# Altium footprint library ref-packages-longpad.PCBLIB: 1527 footprints (part 45 of 103)
Each footprint in its own frame and in the unit in brackets; x right, y up, seen from the top. Pads: shape width x height; smd on the part's side, far side on the other; paste and mask are expansions set on the pad; w line width, h text height; cw(c..) or ccw(c..) is an arc to the next point about the centre after c.
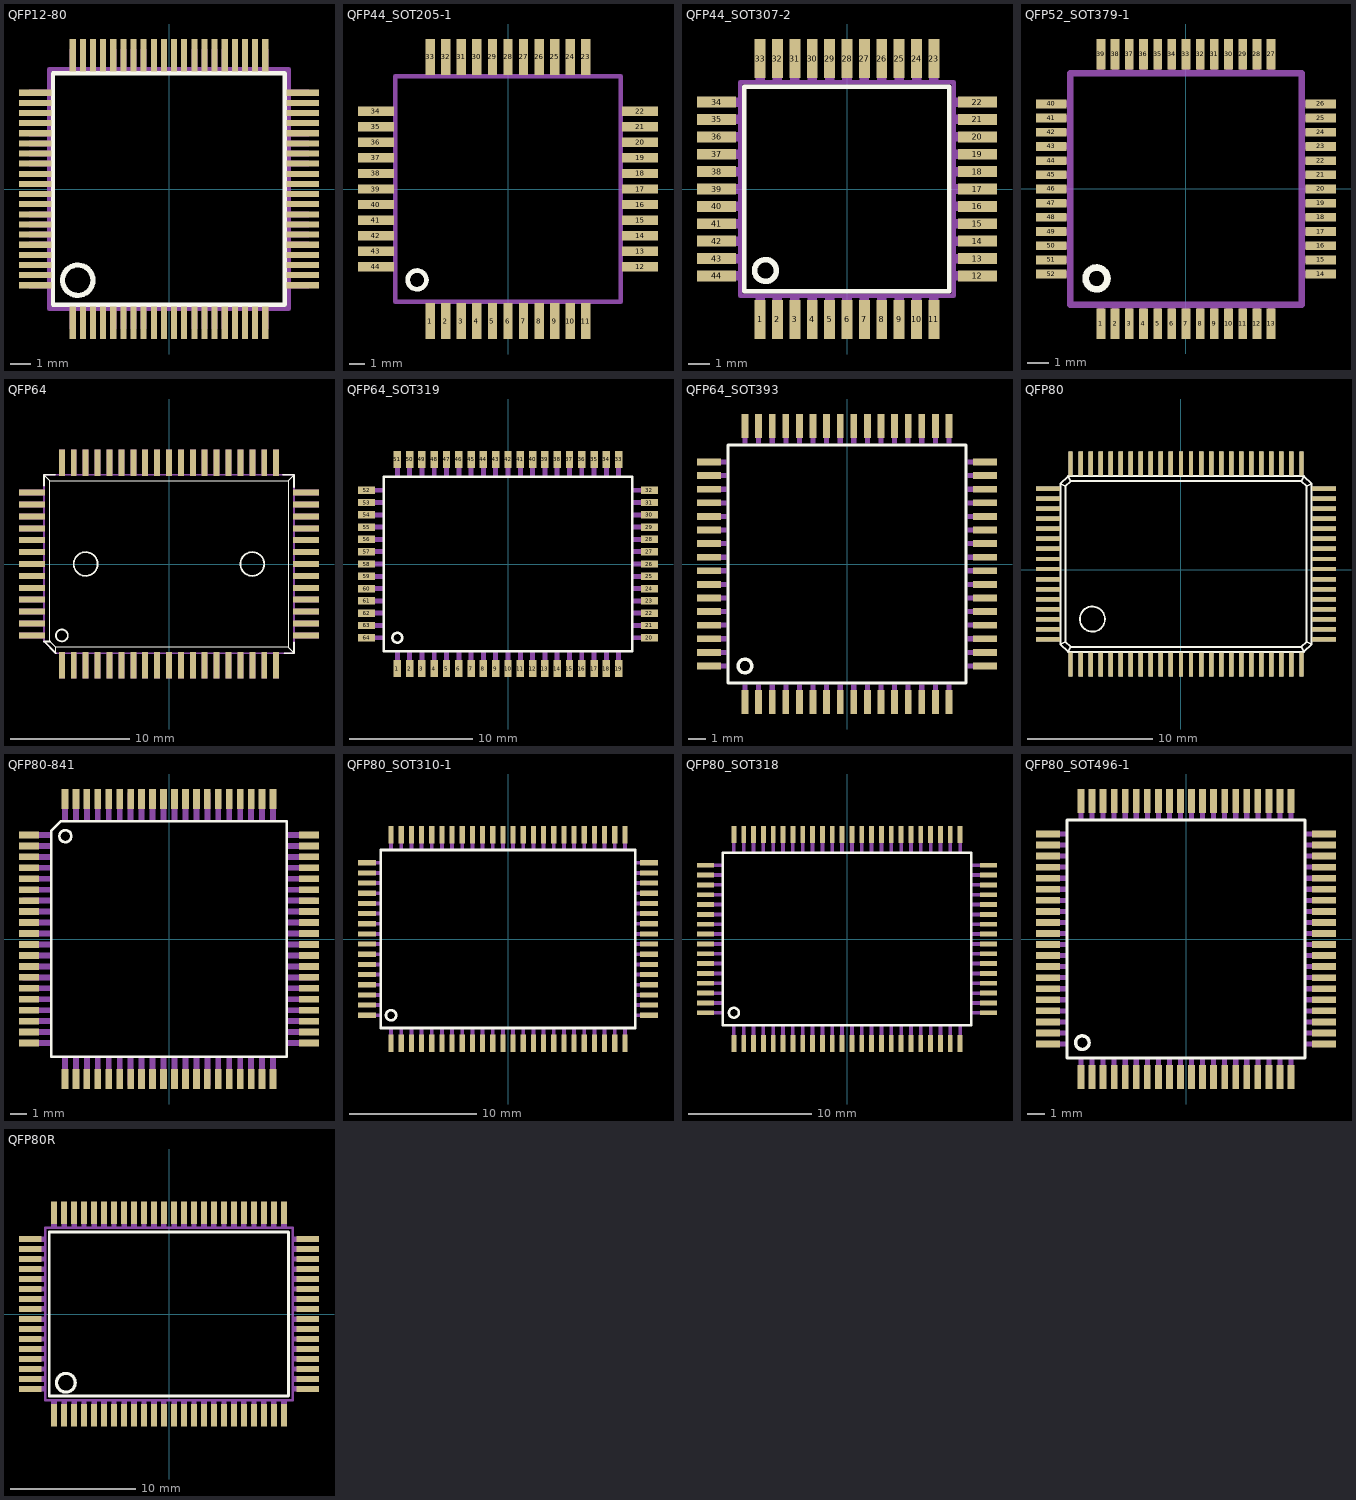
[diagram p44: the footprints below, top view; thin cyan lines are the x and y axes]

## QFP12-80 [mil]
pads (80):
  rect 11.81x62.99 smd: 1(-187.01,-259.84) 2(-167.32,-259.84) 3(-147.64,-259.84) 4(-127.95,-259.84) 5(-108.27,-259.84) 6(-88.58,-259.84) 7(-68.9,-259.84) 8(-49.21,-259.84) 9(-29.53,-259.84) 10(-9.84,-259.84) 11(9.84,-259.84) 12(29.53,-259.84) 13(49.21,-259.84) 14(68.9,-259.84) 15(88.58,-259.84) 16(108.27,-259.84) 17(127.95,-259.84) 18(147.64,-259.84) 19(167.32,-259.84) 20(187.01,-259.84) 41(187.01,259.84) 42(167.32,259.84) 43(147.64,259.84) 44(127.95,259.84) 45(108.27,259.84) 46(88.58,259.84) 47(68.9,259.84) 48(49.21,259.84) 49(29.53,259.84) 50(9.84,259.84) 51(-9.84,259.84) 52(-29.53,259.84) 53(-49.21,259.84) 54(-68.9,259.84) 55(-88.58,259.84) 56(-108.27,259.84) 57(-127.95,259.84) 58(-147.64,259.84) 59(-167.32,259.84) 60(-187.01,259.84)
  rect 62.99x11.81 smd: 21(259.84,-187.01) 22(259.84,-167.32) 23(259.84,-147.64) 24(259.84,-127.95) 25(259.84,-108.27) 26(259.84,-88.58) 27(259.84,-68.9) 28(259.84,-49.21) 29(259.84,-29.53) 30(259.84,-9.84) 31(259.84,9.84) 32(259.84,29.53) 33(259.84,49.21) 34(259.84,68.9) 35(259.84,88.58) 36(259.84,108.27) 37(259.84,127.95) 38(259.84,147.64) 39(259.84,167.32) 40(259.84,187.01) 61(-259.84,187.01) 62(-259.84,167.32) 63(-259.84,147.64) 64(-259.84,127.95) 65(-259.84,108.27) 66(-259.84,88.58) 67(-259.84,68.9) 68(-259.84,49.21) 69(-259.84,29.53) 70(-259.84,9.84) 71(-259.84,-9.84) 72(-259.84,-29.53) 73(-259.84,-49.21) 74(-259.84,-68.9) 75(-259.84,-88.58) 76(-259.84,-108.27) 77(-259.84,-127.95) 78(-259.84,-147.64) 79(-259.84,-167.32) 80(-259.84,-187.01)
Top Overlay:
  circle w10: c-177.17,-177.17 r29.53
  lines w8: -225.2,-224.8 224.8,-224.8 224.8,224.8 -225.2,224.8 -225.2,-224.8
Mechanical 16:
  rectangle: -192.91,-271.65 -181.1,-234.25
  rectangle: -173.23,-271.65 -161.42,-234.25
  rectangle: -153.54,-271.65 -141.73,-234.25
  rectangle: -133.86,-271.65 -122.05,-234.25
  rectangle: -114.17,-271.65 -102.36,-234.25
  rectangle: -94.49,-271.65 -82.68,-234.25
  rectangle: -74.8,-271.65 -62.99,-234.25
  rectangle: -55.12,-271.65 -43.31,-234.25
  rectangle: -35.43,-271.65 -23.62,-234.25
  rectangle: -15.75,-271.65 -3.94,-234.25
  rectangle: 3.94,-271.65 15.75,-234.25
  rectangle: 23.62,-271.65 35.43,-234.25
  rectangle: 43.31,-271.65 55.12,-234.25
  rectangle: 62.99,-271.65 74.8,-234.25
  rectangle: 82.68,-271.65 94.49,-234.25
  rectangle: 102.36,-271.65 114.17,-234.25
  rectangle: 122.05,-271.65 133.86,-234.25
  rectangle: 141.73,-271.65 153.54,-234.25
  rectangle: 161.42,-271.65 173.23,-234.25
  rectangle: 181.1,-271.65 192.91,-234.25
  rectangle: 234.25,-192.91 271.65,-181.1
  rectangle: 234.25,-173.23 271.65,-161.42
  rectangle: 234.25,-153.54 271.65,-141.73
  rectangle: 234.25,-133.86 271.65,-122.05
  rectangle: 234.25,-114.17 271.65,-102.36
  rectangle: 234.25,-94.49 271.65,-82.68
  rectangle: 234.25,-74.8 271.65,-62.99
  rectangle: 234.25,-55.12 271.65,-43.31
  rectangle: 234.25,-35.43 271.65,-23.62
  rectangle: 234.25,-15.75 271.65,-3.94
  rectangle: 234.25,3.94 271.65,15.75
  rectangle: 234.25,23.62 271.65,35.43
  rectangle: 234.25,43.31 271.65,55.12
  rectangle: 234.25,62.99 271.65,74.8
  rectangle: 234.25,82.68 271.65,94.49
  rectangle: 234.25,102.36 271.65,114.17
  rectangle: 234.25,122.05 271.65,133.86
  rectangle: 234.25,141.73 271.65,153.54
  rectangle: 234.25,161.42 271.65,173.23
  rectangle: 234.25,181.1 271.65,192.91
  rectangle: 181.1,234.25 192.91,271.65
  rectangle: 161.42,234.25 173.23,271.65
  rectangle: 141.73,234.25 153.54,271.65
  rectangle: 122.05,234.25 133.86,271.65
  rectangle: 102.36,234.25 114.17,271.65
  rectangle: 82.68,234.25 94.49,271.65
  rectangle: 62.99,234.25 74.8,271.65
  rectangle: 43.31,234.25 55.12,271.65
  rectangle: 23.62,234.25 35.43,271.65
  rectangle: 3.94,234.25 15.75,271.65
  rectangle: -15.75,234.25 -3.94,271.65
  rectangle: -35.43,234.25 -23.62,271.65
  rectangle: -55.12,234.25 -43.31,271.65
  rectangle: -74.8,234.25 -62.99,271.65
  rectangle: -94.49,234.25 -82.68,271.65
  rectangle: -114.17,234.25 -102.36,271.65
  rectangle: -133.86,234.25 -122.05,271.65
  rectangle: -153.54,234.25 -141.73,271.65
  rectangle: -173.23,234.25 -161.42,271.65
  rectangle: -192.91,234.25 -181.1,271.65
  rectangle: -271.65,181.1 -234.25,192.91
  rectangle: -271.65,161.42 -234.25,173.23
  rectangle: -271.65,141.73 -234.25,153.54
  rectangle: -271.65,122.05 -234.25,133.86
  rectangle: -271.65,102.36 -234.25,114.17
  rectangle: -271.65,82.68 -234.25,94.49
  rectangle: -271.65,62.99 -234.25,74.8
  rectangle: -271.65,43.31 -234.25,55.12
  rectangle: -271.65,23.62 -234.25,35.43
  rectangle: -271.65,3.94 -234.25,15.75
  rectangle: -271.65,-15.75 -234.25,-3.94
  rectangle: -271.65,-35.43 -234.25,-23.62
  rectangle: -271.65,-55.12 -234.25,-43.31
  rectangle: -271.65,-74.8 -234.25,-62.99
  rectangle: -271.65,-94.49 -234.25,-82.68
  rectangle: -271.65,-114.17 -234.25,-102.36
  rectangle: -271.65,-133.86 -234.25,-122.05
  rectangle: -271.65,-153.54 -234.25,-141.73
  rectangle: -271.65,-173.23 -234.25,-161.42
  rectangle: -271.65,-192.91 -234.25,-181.1
  lines w8: -232.68,-232.68 232.68,-232.68 232.68,232.68 -232.68,232.68 -232.68,-232.68

## QFP44_SOT205-1 [mm]
pads (44):
  rect 0.6x2.3 smd: 1(-5,-8.5) 2(-4,-8.5) 3(-3,-8.5) 4(-2,-8.5) 5(-1,-8.5) 6(0,-8.5) 7(1,-8.5) 8(2,-8.5) 9(3,-8.5) 10(4,-8.5) 11(5,-8.5) 23(5,8.5) 24(4,8.5) 25(3,8.5) 26(2,8.5) 27(1,8.5) 28(0,8.5) 29(-1,8.5) 30(-2,8.5) 31(-3,8.5) 32(-4,8.5) 33(-5,8.5)
  rect 2.3x0.6 smd: 12(8.5,-5) 13(8.5,-4) 14(8.5,-3) 15(8.5,-2) 16(8.5,-1) 17(8.5,0) 18(8.5,1) 19(8.5,2) 20(8.5,3) 21(8.5,4) 22(8.5,5) 34(-8.5,5) 35(-8.5,4) 36(-8.5,3) 37(-8.5,2) 38(-8.5,1) 39(-8.5,0) 40(-8.5,-1) 41(-8.5,-2) 42(-8.5,-3) 43(-8.5,-4) 44(-8.5,-5)
Top Overlay:
  circle w0.305: c-5.85,-5.85 r0.6
Mechanical 16:
  rectangle: -5.25,-9.2 -4.75,-7.35
  rectangle: -4.25,-9.2 -3.75,-7.35
  rectangle: -3.25,-9.2 -2.75,-7.35
  rectangle: -2.25,-9.2 -1.75,-7.35
  rectangle: -1.25,-9.2 -0.75,-7.35
  rectangle: -0.25,-9.2 0.25,-7.35
  rectangle: 0.75,-9.2 1.25,-7.35
  rectangle: 1.75,-9.2 2.25,-7.35
  rectangle: 2.75,-9.2 3.25,-7.35
  rectangle: 3.75,-9.2 4.25,-7.35
  rectangle: 4.75,-9.2 5.25,-7.35
  rectangle: 7.35,-5.25 9.2,-4.75
  rectangle: 7.35,-4.25 9.2,-3.75
  rectangle: 7.35,-3.25 9.2,-2.75
  rectangle: 7.35,-2.25 9.2,-1.75
  rectangle: 7.35,-1.25 9.2,-0.75
  rectangle: 7.35,-0.25 9.2,0.25
  rectangle: 7.35,0.75 9.2,1.25
  rectangle: 7.35,1.75 9.2,2.25
  rectangle: 7.35,2.75 9.2,3.25
  rectangle: 7.35,3.75 9.2,4.25
  rectangle: 7.35,4.75 9.2,5.25
  rectangle: 4.75,7.35 5.25,9.2
  rectangle: 3.75,7.35 4.25,9.2
  rectangle: 2.75,7.35 3.25,9.2
  rectangle: 1.75,7.35 2.25,9.2
  rectangle: 0.75,7.35 1.25,9.2
  rectangle: -0.25,7.35 0.25,9.2
  rectangle: -1.25,7.35 -0.75,9.2
  rectangle: -2.25,7.35 -1.75,9.2
  rectangle: -3.25,7.35 -2.75,9.2
  rectangle: -4.25,7.35 -3.75,9.2
  rectangle: -5.25,7.35 -4.75,9.2
  rectangle: -9.2,4.75 -7.35,5.25
  rectangle: -9.2,3.75 -7.35,4.25
  rectangle: -9.2,2.75 -7.35,3.25
  rectangle: -9.2,1.75 -7.35,2.25
  rectangle: -9.2,0.75 -7.35,1.25
  rectangle: -9.2,-0.25 -7.35,0.25
  rectangle: -9.2,-1.25 -7.35,-0.75
  rectangle: -9.2,-2.25 -7.35,-1.75
  rectangle: -9.2,-3.25 -7.35,-2.75
  rectangle: -9.2,-4.25 -7.35,-3.75
  rectangle: -9.2,-5.25 -7.35,-4.75
  lines w0.305: -7.25,-7.25 7.25,-7.25 7.25,7.25 -7.25,7.25 -7.25,-7.25

## QFP44_SOT307-2 [mm]
pads (44):
  rect 0.5x1.8 smd: 1(-4,-6) 2(-3.2,-6) 3(-2.4,-6) 4(-1.6,-6) 5(-0.8,-6) 6(0,-6) 7(0.8,-6) 8(1.6,-6) 9(2.4,-6) 10(3.2,-6) 11(4,-6) 23(4,6) 24(3.2,6) 25(2.4,6) 26(1.6,6) 27(0.8,6) 28(0,6) 29(-0.8,6) 30(-1.6,6) 31(-2.4,6) 32(-3.2,6) 33(-4,6)
  rect 1.8x0.5 smd: 12(6,-4) 13(6,-3.2) 14(6,-2.4) 15(6,-1.6) 16(6,-0.8) 17(6,0) 18(6,0.8) 19(6,1.6) 20(6,2.4) 21(6,3.2) 22(6,4) 34(-6,4) 35(-6,3.2) 36(-6,2.4) 37(-6,1.6) 38(-6,0.8) 39(-6,0) 40(-6,-0.8) 41(-6,-1.6) 42(-6,-2.4) 43(-6,-3.2) 44(-6,-4)
Top Overlay:
  circle w0.254: c-3.75,-3.75 r0.5
  lines w0.203: -4.72,-4.71 4.71,-4.71 4.71,4.71 -4.72,4.71 -4.72,-4.71
Mechanical 16:
  rectangle: -4.22,-6.72 -3.78,-4.95
  rectangle: -3.42,-6.72 -2.98,-4.95
  rectangle: -2.62,-6.72 -2.18,-4.95
  rectangle: -1.82,-6.72 -1.38,-4.95
  rectangle: -1.02,-6.72 -0.58,-4.95
  rectangle: -0.22,-6.72 0.22,-4.95
  rectangle: 0.58,-6.72 1.02,-4.95
  rectangle: 1.38,-6.72 1.82,-4.95
  rectangle: 2.18,-6.72 2.62,-4.95
  rectangle: 2.98,-6.72 3.42,-4.95
  rectangle: 3.78,-6.72 4.22,-4.95
  rectangle: 4.95,-4.22 6.72,-3.78
  rectangle: 4.95,-3.42 6.72,-2.98
  rectangle: 4.95,-2.62 6.72,-2.18
  rectangle: 4.95,-1.82 6.72,-1.38
  rectangle: 4.95,-1.02 6.72,-0.58
  rectangle: 4.95,-0.22 6.72,0.22
  rectangle: 4.95,0.58 6.72,1.02
  rectangle: 4.95,1.38 6.72,1.82
  rectangle: 4.95,2.18 6.72,2.62
  rectangle: 4.95,2.98 6.72,3.42
  rectangle: 4.95,3.78 6.72,4.22
  rectangle: 3.78,4.95 4.22,6.72
  rectangle: 2.98,4.95 3.42,6.72
  rectangle: 2.18,4.95 2.62,6.72
  rectangle: 1.38,4.95 1.82,6.72
  rectangle: 0.58,4.95 1.02,6.72
  rectangle: -0.22,4.95 0.22,6.72
  rectangle: -1.02,4.95 -0.58,6.72
  rectangle: -1.82,4.95 -1.38,6.72
  rectangle: -2.62,4.95 -2.18,6.72
  rectangle: -3.42,4.95 -2.98,6.72
  rectangle: -4.22,4.95 -3.78,6.72
  rectangle: -6.72,3.78 -4.95,4.22
  rectangle: -6.72,2.98 -4.95,3.42
  rectangle: -6.72,2.18 -4.95,2.62
  rectangle: -6.72,1.38 -4.95,1.82
  rectangle: -6.72,0.58 -4.95,1.02
  rectangle: -6.72,-0.22 -4.95,0.22
  rectangle: -6.72,-1.02 -4.95,-0.58
  rectangle: -6.72,-1.82 -4.95,-1.38
  rectangle: -6.72,-2.62 -4.95,-2.18
  rectangle: -6.72,-3.42 -4.95,-2.98
  rectangle: -6.72,-4.22 -4.95,-3.78
  lines w0.203: -4.91,-4.91 4.91,-4.91 4.91,4.91 -4.91,4.91 -4.91,-4.91

## QFP52_SOT379-1 [mm]
pads (52):
  rect 0.4x1.4 smd: 1(-3.9,-6.175) 2(-3.25,-6.175) 3(-2.6,-6.175) 4(-1.95,-6.175) 5(-1.3,-6.175) 6(-0.65,-6.175) 7(0,-6.175) 8(0.65,-6.175) 9(1.3,-6.175) 10(1.95,-6.175) 11(2.6,-6.175) 12(3.25,-6.175) 13(3.9,-6.175) 27(3.9,6.175) 28(3.25,6.175) 29(2.6,6.175) 30(1.95,6.175) 31(1.3,6.175) 32(0.65,6.175) 33(0,6.175) 34(-0.65,6.175) 35(-1.3,6.175) 36(-1.95,6.175) 37(-2.6,6.175) 38(-3.25,6.175) 39(-3.9,6.175)
  rect 1.4x0.4 smd: 14(6.175,-3.9) 15(6.175,-3.25) 16(6.175,-2.6) 17(6.175,-1.95) 18(6.175,-1.3) 19(6.175,-0.65) 20(6.175,0) 21(6.175,0.65) 22(6.175,1.3) 23(6.175,1.95) 24(6.175,2.6) 25(6.175,3.25) 26(6.175,3.9) 40(-6.175,3.9) 41(-6.175,3.25) 42(-6.175,2.6) 43(-6.175,1.95) 44(-6.175,1.3) 45(-6.175,0.65) 46(-6.175,0) 47(-6.175,-0.65) 48(-6.175,-1.3) 49(-6.175,-1.95) 50(-6.175,-2.6) 51(-6.175,-3.25) 52(-6.175,-3.9)
Top Overlay:
  circle w0.305: c-4.1,-4.1 r0.5
Mechanical 16:
  rectangle: -4.05,-6.6 -3.75,-5.4
  rectangle: -3.4,-6.6 -3.1,-5.4
  rectangle: -2.75,-6.6 -2.45,-5.4
  rectangle: -2.1,-6.6 -1.8,-5.4
  rectangle: -1.45,-6.6 -1.15,-5.4
  rectangle: -0.8,-6.6 -0.5,-5.4
  rectangle: -0.15,-6.6 0.15,-5.4
  rectangle: 0.5,-6.6 0.8,-5.4
  rectangle: 1.15,-6.6 1.45,-5.4
  rectangle: 1.8,-6.6 2.1,-5.4
  rectangle: 2.45,-6.6 2.75,-5.4
  rectangle: 3.1,-6.6 3.4,-5.4
  rectangle: 3.75,-6.6 4.05,-5.4
  rectangle: 5.4,-4.05 6.6,-3.75
  rectangle: 5.4,-3.4 6.6,-3.1
  rectangle: 5.4,-2.75 6.6,-2.45
  rectangle: 5.4,-2.1 6.6,-1.8
  rectangle: 5.4,-1.45 6.6,-1.15
  rectangle: 5.4,-0.8 6.6,-0.5
  rectangle: 5.4,-0.15 6.6,0.15
  rectangle: 5.4,0.5 6.6,0.8
  rectangle: 5.4,1.15 6.6,1.45
  rectangle: 5.4,1.8 6.6,2.1
  rectangle: 5.4,2.45 6.6,2.75
  rectangle: 5.4,3.1 6.6,3.4
  rectangle: 5.4,3.75 6.6,4.05
  rectangle: 3.75,5.4 4.05,6.6
  rectangle: 3.1,5.4 3.4,6.6
  rectangle: 2.45,5.4 2.75,6.6
  rectangle: 1.8,5.4 2.1,6.6
  rectangle: 1.15,5.4 1.45,6.6
  rectangle: 0.5,5.4 0.8,6.6
  rectangle: -0.15,5.4 0.15,6.6
  rectangle: -0.8,5.4 -0.5,6.6
  rectangle: -1.45,5.4 -1.15,6.6
  rectangle: -2.1,5.4 -1.8,6.6
  rectangle: -2.75,5.4 -2.45,6.6
  rectangle: -3.4,5.4 -3.1,6.6
  rectangle: -4.05,5.4 -3.75,6.6
  rectangle: -6.6,3.75 -5.4,4.05
  rectangle: -6.6,3.1 -5.4,3.4
  rectangle: -6.6,2.45 -5.4,2.75
  rectangle: -6.6,1.8 -5.4,2.1
  rectangle: -6.6,1.15 -5.4,1.45
  rectangle: -6.6,0.5 -5.4,0.8
  rectangle: -6.6,-0.15 -5.4,0.15
  rectangle: -6.6,-0.8 -5.4,-0.5
  rectangle: -6.6,-1.45 -5.4,-1.15
  rectangle: -6.6,-2.1 -5.4,-1.8
  rectangle: -6.6,-2.75 -5.4,-2.45
  rectangle: -6.6,-3.4 -5.4,-3.1
  rectangle: -6.6,-4.05 -5.4,-3.75
  lines w0.305: -5.3,-5.3 5.3,-5.3 5.3,5.3 -5.3,5.3 -5.3,-5.3

## QFP64 [mm]
pads (64):
  rect 0.5x2.2 smd: 1(-9,-8.5) 2(-8,-8.5) 3(-7,-8.5) 4(-6,-8.5) 5(-5,-8.5) 6(-4,-8.5) 7(-3,-8.5) 8(-2,-8.5) 9(-1,-8.5) 10(0,-8.5) 11(1,-8.5) 12(2,-8.5) 13(3,-8.5) 14(4,-8.5) 15(5,-8.5) 16(6,-8.5) 17(7,-8.5) 18(8,-8.5) 19(9,-8.5) 33(9,8.5) 34(8,8.5) 35(7,8.5) 36(6,8.5) 37(5,8.5) 38(4,8.5) 39(3,8.5) 40(2,8.5) 41(1,8.5) 42(0,8.5) 43(-1,8.5) 44(-2,8.5) 45(-3,8.5) 46(-4,8.5) 47(-5,8.5) 48(-6,8.5) 49(-7,8.5) 50(-8,8.5) 51(-9,8.5)
  rect 2.2x0.5 smd: 20(11.5,-6) 21(11.5,-5) 22(11.5,-4) 23(11.5,-3) 24(11.5,-2) 25(11.5,-1) 26(11.5,0) 27(11.5,1) 28(11.5,2) 29(11.5,3) 30(11.5,4) 31(11.5,5) 32(11.5,6) 52(-11.5,6) 53(-11.5,5) 54(-11.5,4) 55(-11.5,3) 56(-11.5,2) 57(-11.5,1) 58(-11.5,0) 59(-11.5,-1) 60(-11.5,-2) 61(-11.5,-3) 62(-11.5,-4) 63(-11.5,-5) 64(-11.5,-6)
Top Overlay:
  circle w0.152: c-9,-6 r0.5
  circle w0.152: c7,0 r1
  circle w0.152: c-7,0 r1
  lines w0.051: -10.5,7.5 -10,7 ; -9.5,-7.5 -9.5,-7 ; 10.5,-7.5 10,-7 ; 10.5,7.5 10,7 ; -10,7 10,7 ; -10,7 -10,-6.5 -9.5,-7 ; -9.5,-7 10,-7 ; 10,-7 10,7
  lines w0.152: -10.5,6.581 -10.5,7.5 -9.566,7.5 ; -10,-6.5 -10.5,-6.5 -9.5,-7.5 ; 9.566,7.5 10.5,7.5 10.5,6.47 ; 9.677,-7.5 10.5,-7.5 10.5,-6.597
Mechanical 16:
  rectangle: -9.25,7.55 -8.75,9.6
  rectangle: -8.25,7.55 -7.75,9.6
  rectangle: -7.25,7.55 -6.75,9.6
  rectangle: -6.25,7.55 -5.75,9.6
  rectangle: -5.25,7.55 -4.75,9.6
  rectangle: -4.25,7.55 -3.75,9.6
  rectangle: -3.25,7.55 -2.75,9.6
  rectangle: -2.25,7.55 -1.75,9.6
  rectangle: -1.25,7.55 -0.75,9.6
  rectangle: -0.25,7.55 0.25,9.6
  rectangle: 0.75,7.55 1.25,9.6
  rectangle: 1.75,7.55 2.25,9.6
  rectangle: 2.75,7.55 3.25,9.6
  rectangle: 3.75,7.55 4.25,9.6
  rectangle: 4.75,7.55 5.25,9.6
  rectangle: 5.75,7.55 6.25,9.6
  rectangle: 6.75,7.55 7.25,9.6
  rectangle: 7.75,7.55 8.25,9.6
  rectangle: 8.75,7.55 9.25,9.6
  rectangle: 10.55,4.75 12.6,5.25
  rectangle: 10.55,5.75 12.6,6.25
  rectangle: 10.55,3.75 12.6,4.25
  rectangle: 10.55,2.75 12.6,3.25
  rectangle: 10.55,1.75 12.6,2.25
  rectangle: 10.55,0.75 12.6,1.25
  rectangle: 10.55,-0.25 12.6,0.25
  rectangle: 10.55,-1.25 12.6,-0.75
  rectangle: 10.55,-2.25 12.6,-1.75
  rectangle: 10.55,-3.25 12.6,-2.75
  rectangle: 10.55,-4.25 12.6,-3.75
  rectangle: 10.55,-5.25 12.6,-4.75
  rectangle: 10.55,-6.25 12.6,-5.75
  rectangle: 8.75,-9.6 9.25,-7.55
  rectangle: 7.75,-9.6 8.25,-7.55
  rectangle: 6.75,-9.6 7.25,-7.55
  rectangle: 5.75,-9.6 6.25,-7.55
  rectangle: 4.75,-9.6 5.25,-7.55
  rectangle: 3.75,-9.6 4.25,-7.55
  rectangle: 2.75,-9.6 3.25,-7.55
  rectangle: 1.75,-9.6 2.25,-7.55
  rectangle: 0.75,-9.6 1.25,-7.55
  rectangle: -0.25,-9.6 0.25,-7.55
  rectangle: -1.25,-9.6 -0.75,-7.55
  rectangle: -2.25,-9.6 -1.75,-7.55
  rectangle: -3.25,-9.6 -2.75,-7.55
  rectangle: -4.25,-9.6 -3.75,-7.55
  rectangle: -5.25,-9.6 -4.75,-7.55
  rectangle: -6.25,-9.6 -5.75,-7.55
  rectangle: -7.25,-9.6 -6.75,-7.55
  rectangle: -8.25,-9.6 -7.75,-7.55
  rectangle: -12.6,5.75 -10.55,6.25
  rectangle: -12.6,4.75 -10.55,5.25
  rectangle: -12.6,3.75 -10.55,4.25
  rectangle: -12.6,2.75 -10.55,3.25
  rectangle: -12.6,1.75 -10.55,2.25
  rectangle: -12.6,0.75 -10.55,1.25
  rectangle: -12.6,-0.25 -10.55,0.25
  rectangle: -12.6,-1.25 -10.55,-0.75
  rectangle: -12.6,-2.25 -10.55,-1.75
  rectangle: -12.6,-3.25 -10.55,-2.75
  rectangle: -12.6,-4.25 -10.55,-3.75
  rectangle: -12.6,-5.25 -10.55,-4.75
  rectangle: -12.6,-6.25 -10.55,-5.75
  rectangle: -9.25,-9.6 -8.75,-7.55
  lines w0.051: -10.5,-6.5 -10,-6.5 ; -9.5,-7.5 -9.5,-7
  lines w0.152: -10.5,-6.5 -9.5,-7.5 10.5,-7.5 10.5,7.5 -10.5,7.5 -10.5,-6.5

## QFP64_SOT319 [mm]
pads (64):
  rect 0.6x1.4 smd: 1(-9,-8.5) 2(-8,-8.5) 3(-7,-8.5) 4(-6,-8.5) 5(-5,-8.5) 6(-4,-8.5) 7(-3,-8.5) 8(-2,-8.5) 9(-1,-8.5) 10(0,-8.5) 11(1,-8.5) 12(2,-8.5) 13(3,-8.5) 14(4,-8.5) 15(5,-8.5) 16(6,-8.5) 17(7,-8.5) 18(8,-8.5) 19(9,-8.5) 33(9,8.5) 34(8,8.5) 35(7,8.5) 36(6,8.5) 37(5,8.5) 38(4,8.5) 39(3,8.5) 40(2,8.5) 41(1,8.5) 42(0,8.5) 43(-1,8.5) 44(-2,8.5) 45(-3,8.5) 46(-4,8.5) 47(-5,8.5) 48(-6,8.5) 49(-7,8.5) 50(-8,8.5) 51(-9,8.5)
  rect 1.4x0.6 smd: 20(11.5,-6) 21(11.5,-5) 22(11.5,-4) 23(11.5,-3) 24(11.5,-2) 25(11.5,-1) 26(11.5,0) 27(11.5,1) 28(11.5,2) 29(11.5,3) 30(11.5,4) 31(11.5,5) 32(11.5,6) 52(-11.5,6) 53(-11.5,5) 54(-11.5,4) 55(-11.5,3) 56(-11.5,2) 57(-11.5,1) 58(-11.5,0) 59(-11.5,-1) 60(-11.5,-2) 61(-11.5,-3) 62(-11.5,-4) 63(-11.5,-5) 64(-11.5,-6)
Top Overlay:
  circle w0.203: c-9,-6 r0.4
  lines w0.203: -10.1,-7.1 10.1,-7.1 10.1,7.1 -10.1,7.1 -10.1,-7.1
Mechanical 16:
  rectangle: -9.2,-8.8 -8.8,-7.15
  rectangle: -8.2,-8.8 -7.8,-7.15
  rectangle: -7.2,-8.8 -6.8,-7.15
  rectangle: -6.2,-8.8 -5.8,-7.15
  rectangle: -5.2,-8.8 -4.8,-7.15
  rectangle: -4.2,-8.8 -3.8,-7.15
  rectangle: -3.2,-8.8 -2.8,-7.15
  rectangle: -2.2,-8.8 -1.8,-7.15
  rectangle: -1.2,-8.8 -0.8,-7.15
  rectangle: -0.2,-8.8 0.2,-7.15
  rectangle: 0.8,-8.8 1.2,-7.15
  rectangle: 1.8,-8.8 2.2,-7.15
  rectangle: 2.8,-8.8 3.2,-7.15
  rectangle: 3.8,-8.8 4.2,-7.15
  rectangle: 4.8,-8.8 5.2,-7.15
  rectangle: 5.8,-8.8 6.2,-7.15
  rectangle: 6.8,-8.8 7.2,-7.15
  rectangle: 7.8,-8.8 8.2,-7.15
  rectangle: 8.8,-8.8 9.2,-7.15
  rectangle: 10.15,-6.2 11.8,-5.8
  rectangle: 10.15,-5.2 11.8,-4.8
  rectangle: 10.15,-4.2 11.8,-3.8
  rectangle: 10.15,-3.2 11.8,-2.8
  rectangle: 10.15,-2.2 11.8,-1.8
  rectangle: 10.15,-1.2 11.8,-0.8
  rectangle: 10.15,-0.2 11.8,0.2
  rectangle: 10.15,0.8 11.8,1.2
  rectangle: 10.15,1.8 11.8,2.2
  rectangle: 10.15,2.8 11.8,3.2
  rectangle: 10.15,3.8 11.8,4.2
  rectangle: 10.15,4.8 11.8,5.2
  rectangle: 10.15,5.8 11.8,6.2
  rectangle: 8.8,7.15 9.2,8.8
  rectangle: 7.8,7.15 8.2,8.8
  rectangle: 6.8,7.15 7.2,8.8
  rectangle: 5.8,7.15 6.2,8.8
  rectangle: 4.8,7.15 5.2,8.8
  rectangle: 3.8,7.15 4.2,8.8
  rectangle: 2.8,7.15 3.2,8.8
  rectangle: 1.8,7.15 2.2,8.8
  rectangle: 0.8,7.15 1.2,8.8
  rectangle: -0.2,7.15 0.2,8.8
  rectangle: -1.2,7.15 -0.8,8.8
  rectangle: -2.2,7.15 -1.8,8.8
  rectangle: -3.2,7.15 -2.8,8.8
  rectangle: -4.2,7.15 -3.8,8.8
  rectangle: -5.2,7.15 -4.8,8.8
  rectangle: -6.2,7.15 -5.8,8.8
  rectangle: -7.2,7.15 -6.8,8.8
  rectangle: -8.2,7.15 -7.8,8.8
  rectangle: -9.2,7.15 -8.8,8.8
  rectangle: -11.8,5.8 -10.15,6.2
  rectangle: -11.8,4.8 -10.15,5.2
  rectangle: -11.8,3.8 -10.15,4.2
  rectangle: -11.8,2.8 -10.15,3.2
  rectangle: -11.8,1.8 -10.15,2.2
  rectangle: -11.8,0.8 -10.15,1.2
  rectangle: -11.8,-0.2 -10.15,0.2
  rectangle: -11.8,-1.2 -10.15,-0.8
  rectangle: -11.8,-2.2 -10.15,-1.8
  rectangle: -11.8,-3.2 -10.15,-2.8
  rectangle: -11.8,-4.2 -10.15,-3.8
  rectangle: -11.8,-5.2 -10.15,-4.8
  rectangle: -11.8,-6.2 -10.15,-5.8

## QFP64_SOT393 [mm]
pads (64):
  rect 0.4x1.4 smd: 1(-6,-8.125) 2(-5.2,-8.125) 3(-4.4,-8.125) 4(-3.6,-8.125) 5(-2.8,-8.125) 6(-2,-8.125) 7(-1.2,-8.125) 8(-0.4,-8.125) 9(0.4,-8.125) 10(1.2,-8.125) 11(2,-8.125) 12(2.8,-8.125) 13(3.6,-8.125) 14(4.4,-8.125) 15(5.2,-8.125) 16(6,-8.125) 33(6,8.125) 34(5.2,8.125) 35(4.4,8.125) 36(3.6,8.125) 37(2.8,8.125) 38(2,8.125) 39(1.2,8.125) 40(0.4,8.125) 41(-0.4,8.125) 42(-1.2,8.125) 43(-2,8.125) 44(-2.8,8.125) 45(-3.6,8.125) 46(-4.4,8.125) 47(-5.2,8.125) 48(-6,8.125)
  rect 1.4x0.4 smd: 17(8.125,-6) 18(8.125,-5.2) 19(8.125,-4.4) 20(8.125,-3.6) 21(8.125,-2.8) 22(8.125,-2) 23(8.125,-1.2) 24(8.125,-0.4) 25(8.125,0.4) 26(8.125,1.2) 27(8.125,2) 28(8.125,2.8) 29(8.125,3.6) 30(8.125,4.4) 31(8.125,5.2) 32(8.125,6) 49(-8.125,6) 50(-8.125,5.2) 51(-8.125,4.4) 52(-8.125,3.6) 53(-8.125,2.8) 54(-8.125,2) 55(-8.125,1.2) 56(-8.125,0.4) 57(-8.125,-0.4) 58(-8.125,-1.2) 59(-8.125,-2) 60(-8.125,-2.8) 61(-8.125,-3.6) 62(-8.125,-4.4) 63(-8.125,-5.2) 64(-8.125,-6)
Top Overlay:
  circle w0.203: c-6,-6 r0.4
  lines w0.203: -7,-7 7,-7 7,7 -7,7 -7,-7
Mechanical 16:
  rectangle: -6.15,-8.6 -5.85,-7.075
  rectangle: -5.35,-8.6 -5.05,-7.075
  rectangle: -4.55,-8.6 -4.25,-7.075
  rectangle: -3.75,-8.6 -3.45,-7.075
  rectangle: -2.95,-8.6 -2.65,-7.075
  rectangle: -2.15,-8.6 -1.85,-7.075
  rectangle: -1.35,-8.6 -1.05,-7.075
  rectangle: -0.55,-8.6 -0.25,-7.075
  rectangle: 0.25,-8.6 0.55,-7.075
  rectangle: 1.05,-8.6 1.35,-7.075
  rectangle: 1.85,-8.6 2.15,-7.075
  rectangle: 2.65,-8.6 2.95,-7.075
  rectangle: 3.45,-8.6 3.75,-7.075
  rectangle: 4.25,-8.6 4.55,-7.075
  rectangle: 5.05,-8.6 5.35,-7.075
  rectangle: 5.85,-8.6 6.15,-7.075
  rectangle: 7.075,-6.15 8.6,-5.85
  rectangle: 7.075,-5.35 8.6,-5.05
  rectangle: 7.075,-4.55 8.6,-4.25
  rectangle: 7.075,-3.75 8.6,-3.45
  rectangle: 7.075,-2.95 8.6,-2.65
  rectangle: 7.075,-2.15 8.6,-1.85
  rectangle: 7.075,-1.35 8.6,-1.05
  rectangle: 7.075,-0.55 8.6,-0.25
  rectangle: 7.075,0.25 8.6,0.55
  rectangle: 7.075,1.05 8.6,1.35
  rectangle: 7.075,1.85 8.6,2.15
  rectangle: 7.075,2.65 8.6,2.95
  rectangle: 7.075,3.45 8.6,3.75
  rectangle: 7.075,4.25 8.6,4.55
  rectangle: 7.075,5.05 8.6,5.35
  rectangle: 7.075,5.85 8.6,6.15
  rectangle: 5.85,7.075 6.15,8.6
  rectangle: 5.05,7.075 5.35,8.6
  rectangle: 4.25,7.075 4.55,8.6
  rectangle: 3.45,7.075 3.75,8.6
  rectangle: 2.65,7.075 2.95,8.6
  rectangle: 1.85,7.075 2.15,8.6
  rectangle: 1.05,7.075 1.35,8.6
  rectangle: 0.25,7.075 0.55,8.6
  rectangle: -0.55,7.075 -0.25,8.6
  rectangle: -1.35,7.075 -1.05,8.6
  rectangle: -2.15,7.075 -1.85,8.6
  rectangle: -2.95,7.075 -2.65,8.6
  rectangle: -3.75,7.075 -3.45,8.6
  rectangle: -4.55,7.075 -4.25,8.6
  rectangle: -5.35,7.075 -5.05,8.6
  rectangle: -6.15,7.075 -5.85,8.6
  rectangle: -8.6,5.85 -7.075,6.15
  rectangle: -8.6,5.05 -7.075,5.35
  rectangle: -8.6,4.25 -7.075,4.55
  rectangle: -8.6,3.45 -7.075,3.75
  rectangle: -8.6,2.65 -7.075,2.95
  rectangle: -8.6,1.85 -7.075,2.15
  rectangle: -8.6,1.05 -7.075,1.35
  rectangle: -8.6,0.25 -7.075,0.55
  rectangle: -8.6,-0.55 -7.075,-0.25